# Altium footprint library BIOSCOPE-LIB.PcbLib: 33 footprints (part 3 of 3)
Each footprint in its own frame and in the unit in brackets; x right, y up, seen from the top. Pads: shape width x height; smd on the part's side, far side on the other; paste and mask are expansions set on the pad; w line width, h text height; cw(c..) or ccw(c..) is an arc to the next point about the centre after c.
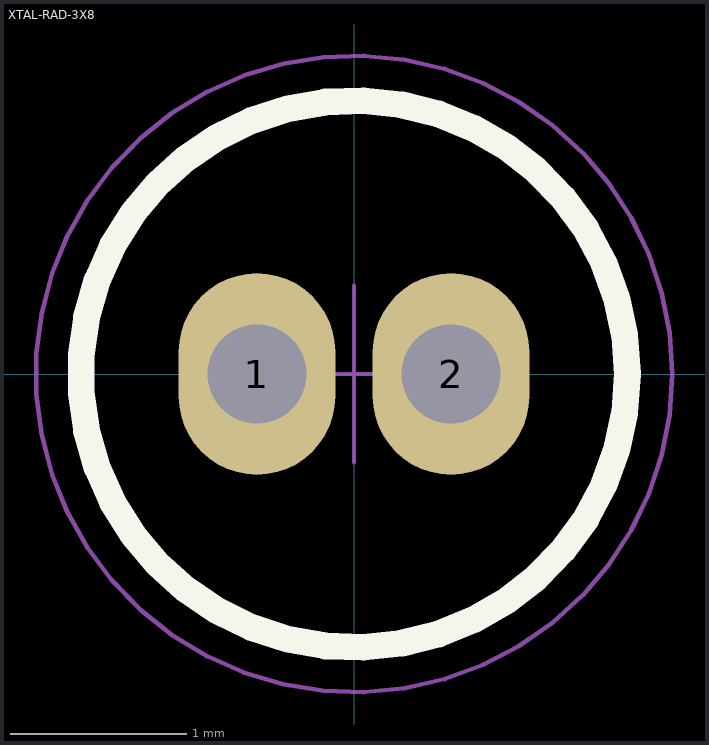
[diagram p2: the footprint, top view; thin cyan lines are the x and y axes]

## XTAL-RAD-3X8 [mil] "Radial Crystal - 3.1mm Dia x 1.1mm spacing"
pads (2):
  oval 35x45 hole 22 mask+2: 1(-21.65,0) 2(21.65,0)
Top Overlay:
  circle w6: c0,0 r61.02
Top Courtyard:
  circle w1: c0,0 r71.02
Top Designator:
  text ".Designator" at -67.48,-6.77 h30
Top Assembly (Mech15):
  lines w1: -19.69,0 19.68,0 ; 0,-19.68 0,19.68 ; -61.02,0 ccw(c0,0) 61.02,0 ccw(c0,0) -61.02,0
3D body "ECS-3X8X_ECS.step": height 323.62, standoff -112.01, extent -61.62,-60.88 61.62,60.88